# Altium integrated library Samtec_2_mm_Pitch_Socket_Strips.IntLib: 251 symbols (part 2 of 3) (continued)
## SQT-108-01-L-Q
designator J?
Cost-Effective Rugged Socket, Through-hole, Vertical, -55 to 125 degC, 2 mm Pitch, 32-Pin, Female, RoHS; Manufacturer: Samtec; PartNumber: SQT-108-01-L-Q; Pitch: 2 mm; DatasheetVersion: F-214; PackageVersion: BY, 7/1995; PackageReference: SQT-108-01-X-Q; PackageDescription: 2mm Socket Strip Assembly; Orientation: Vertical; RoHS: True; Temperature Range: -55 to 125 degC; Mounting Technology: Through-hole; ComponentLink1Description: Manufacturer URL; ComponentLink1URL: http://www.samtec.com; ComponentLink2Description: Datasheet; ComponentLink2URL: http://www.samtec.com/documents/webfiles/pdf/SQT_TH.PDF; ComponentLink3Description: Package Specification; ComponentLink3URL: http://www.samtec.com/documents/webfiles/cpdf/SQT-1XX-XX-XXX-X-XXX-XXX-MKT.pdf
footprint SMTC-SQT-108-01-X-Q (Socket Strip Assembly, 4x8 Pins, Vertical, 2mm Pitch, Female)
pins: 1, 2, 3, 4, 5, 6, 7, 8, 9, 10, 11, 12, 13, 14, 15, 16, 17, 18, 19, 20, 21, 22, 23, 24, 25, 26, 27, 28, 29, 30, 31, 32

## SQT-112-01-F-D
designator J?
Cost-Effective Rugged Socket, Through-hole, Vertical, -55 to 125 degC, 2 mm Pitch, 24-Pin, Female, RoHS; Manufacturer: Samtec; PartNumber: SQT-112-01-F-D; Pitch: 2 mm; DatasheetVersion: F-214; PackageVersion: BY, 7/1995; PackageReference: SQT-112-01-X-D; PackageDescription: 2mm Socket Strip Assembly; Supplier 1: Digi-Key; Supplier Part Number 1: SQT-112-01-F-D-ND; Supplier 2: Newark; Supplier Part Number 2: 80P8384; Orientation: Vertical; RoHS: True; Temperature Range: -55 to 125 degC; Mounting Technology: Through-hole; ComponentLink1Description: Manufacturer URL; ComponentLink1URL: http://www.samtec.com; ComponentLink2Description: Datasheet; ComponentLink2URL: http://www.samtec.com/documents/webfiles/pdf/SQT_TH.PDF; ComponentLink3Description: Package Specification; ComponentLink3URL: http://www.samtec.com/documents/webfiles/cpdf/SQT-1XX-XX-XXX-X-XXX-XXX-MKT.pdf
footprint SMTC-SQT-112-01-X-D (Socket Strip Assembly, 2x12 Pins, Vertical, 2mm Pitch, Female)
pins: 1, 2, 3, 4, 5, 6, 7, 8, 9, 10, 11, 12, 13, 14, 15, 16, 17, 18, 19, 20, 21, 22, 23, 24

## SQT-112-01-L-D
designator J?
Cost-Effective Rugged Socket, Through-hole, Vertical, -55 to 125 degC, 2 mm Pitch, 24-Pin, Female, RoHS; Manufacturer: Samtec; PartNumber: SQT-112-01-L-D; Pitch: 2 mm; DatasheetVersion: F-214; PackageVersion: BY, 7/1995; PackageReference: SQT-112-01-X-D; PackageDescription: 2mm Socket Strip Assembly; Supplier 1: Digi-Key; Supplier Part Number 1: SAM1245-12-ND; Supplier 2: Newark; Supplier Part Number 2: 11P7278; Orientation: Vertical; RoHS: True; Temperature Range: -55 to 125 degC; Mounting Technology: Through-hole; ComponentLink1Description: Manufacturer URL; ComponentLink1URL: http://www.samtec.com; ComponentLink2Description: Datasheet; ComponentLink2URL: http://www.samtec.com/documents/webfiles/pdf/SQT_TH.PDF; ComponentLink3Description: Package Specification; ComponentLink3URL: http://www.samtec.com/documents/webfiles/cpdf/SQT-1XX-XX-XXX-X-XXX-XXX-MKT.pdf
footprint SMTC-SQT-112-01-X-D (Socket Strip Assembly, 2x12 Pins, Vertical, 2mm Pitch, Female)
pins: 1, 2, 3, 4, 5, 6, 7, 8, 9, 10, 11, 12, 13, 14, 15, 16, 17, 18, 19, 20, 21, 22, 23, 24

## SQT-113-01-F-D
designator J?
Cost-Effective Rugged Socket, Through-hole, Vertical, -55 to 125 degC, 2 mm Pitch, 26-Pin, Female, RoHS; Manufacturer: Samtec; PartNumber: SQT-113-01-F-D; Pitch: 2 mm; DatasheetVersion: F-214; PackageVersion: BY, 7/1995; PackageReference: SQT-113-01-X-D; PackageDescription: 2mm Socket Strip Assembly; Supplier 1: Newark; Supplier Part Number 1: 80P8466; Orientation: Vertical; RoHS: True; Temperature Range: -55 to 125 degC; Mounting Technology: Through-hole; ComponentLink1Description: Manufacturer URL; ComponentLink1URL: http://www.samtec.com; ComponentLink2Description: Datasheet; ComponentLink2URL: http://www.samtec.com/documents/webfiles/pdf/SQT_TH.PDF; ComponentLink3Description: Package Specification; ComponentLink3URL: http://www.samtec.com/documents/webfiles/cpdf/SQT-1XX-XX-XXX-X-XXX-XXX-MKT.pdf
footprint SMTC-SQT-113-01-X-D (Socket Strip Assembly, 2x13 Pins, Vertical, 2mm Pitch, Female)
pins: 1, 2, 3, 4, 5, 6, 7, 8, 9, 10, 11, 12, 13, 14, 15, 16, 17, 18, 19, 20, 21, 22, 23, 24, 25, 26

## SQT-113-01-L-D
designator J?
Cost-Effective Rugged Socket, Through-hole, Vertical, -55 to 125 degC, 2 mm Pitch, 26-Pin, Female, RoHS; Manufacturer: Samtec; PartNumber: SQT-113-01-L-D; Pitch: 2 mm; DatasheetVersion: F-214; PackageVersion: BY, 7/1995; PackageReference: SQT-113-01-X-D; PackageDescription: 2mm Socket Strip Assembly; Supplier 1: Digi-Key; Supplier Part Number 1: SAM1245-13-ND; Supplier 2: Newark; Supplier Part Number 2: 11P7282; Orientation: Vertical; RoHS: True; Temperature Range: -55 to 125 degC; Mounting Technology: Through-hole; ComponentLink1Description: Manufacturer URL; ComponentLink1URL: http://www.samtec.com; ComponentLink2Description: Datasheet; ComponentLink2URL: http://www.samtec.com/documents/webfiles/pdf/SQT_TH.PDF; ComponentLink3Description: Package Specification; ComponentLink3URL: http://www.samtec.com/documents/webfiles/cpdf/SQT-1XX-XX-XXX-X-XXX-XXX-MKT.pdf
footprint SMTC-SQT-113-01-X-D (Socket Strip Assembly, 2x13 Pins, Vertical, 2mm Pitch, Female)
pins: 1, 2, 3, 4, 5, 6, 7, 8, 9, 10, 11, 12, 13, 14, 15, 16, 17, 18, 19, 20, 21, 22, 23, 24, 25, 26

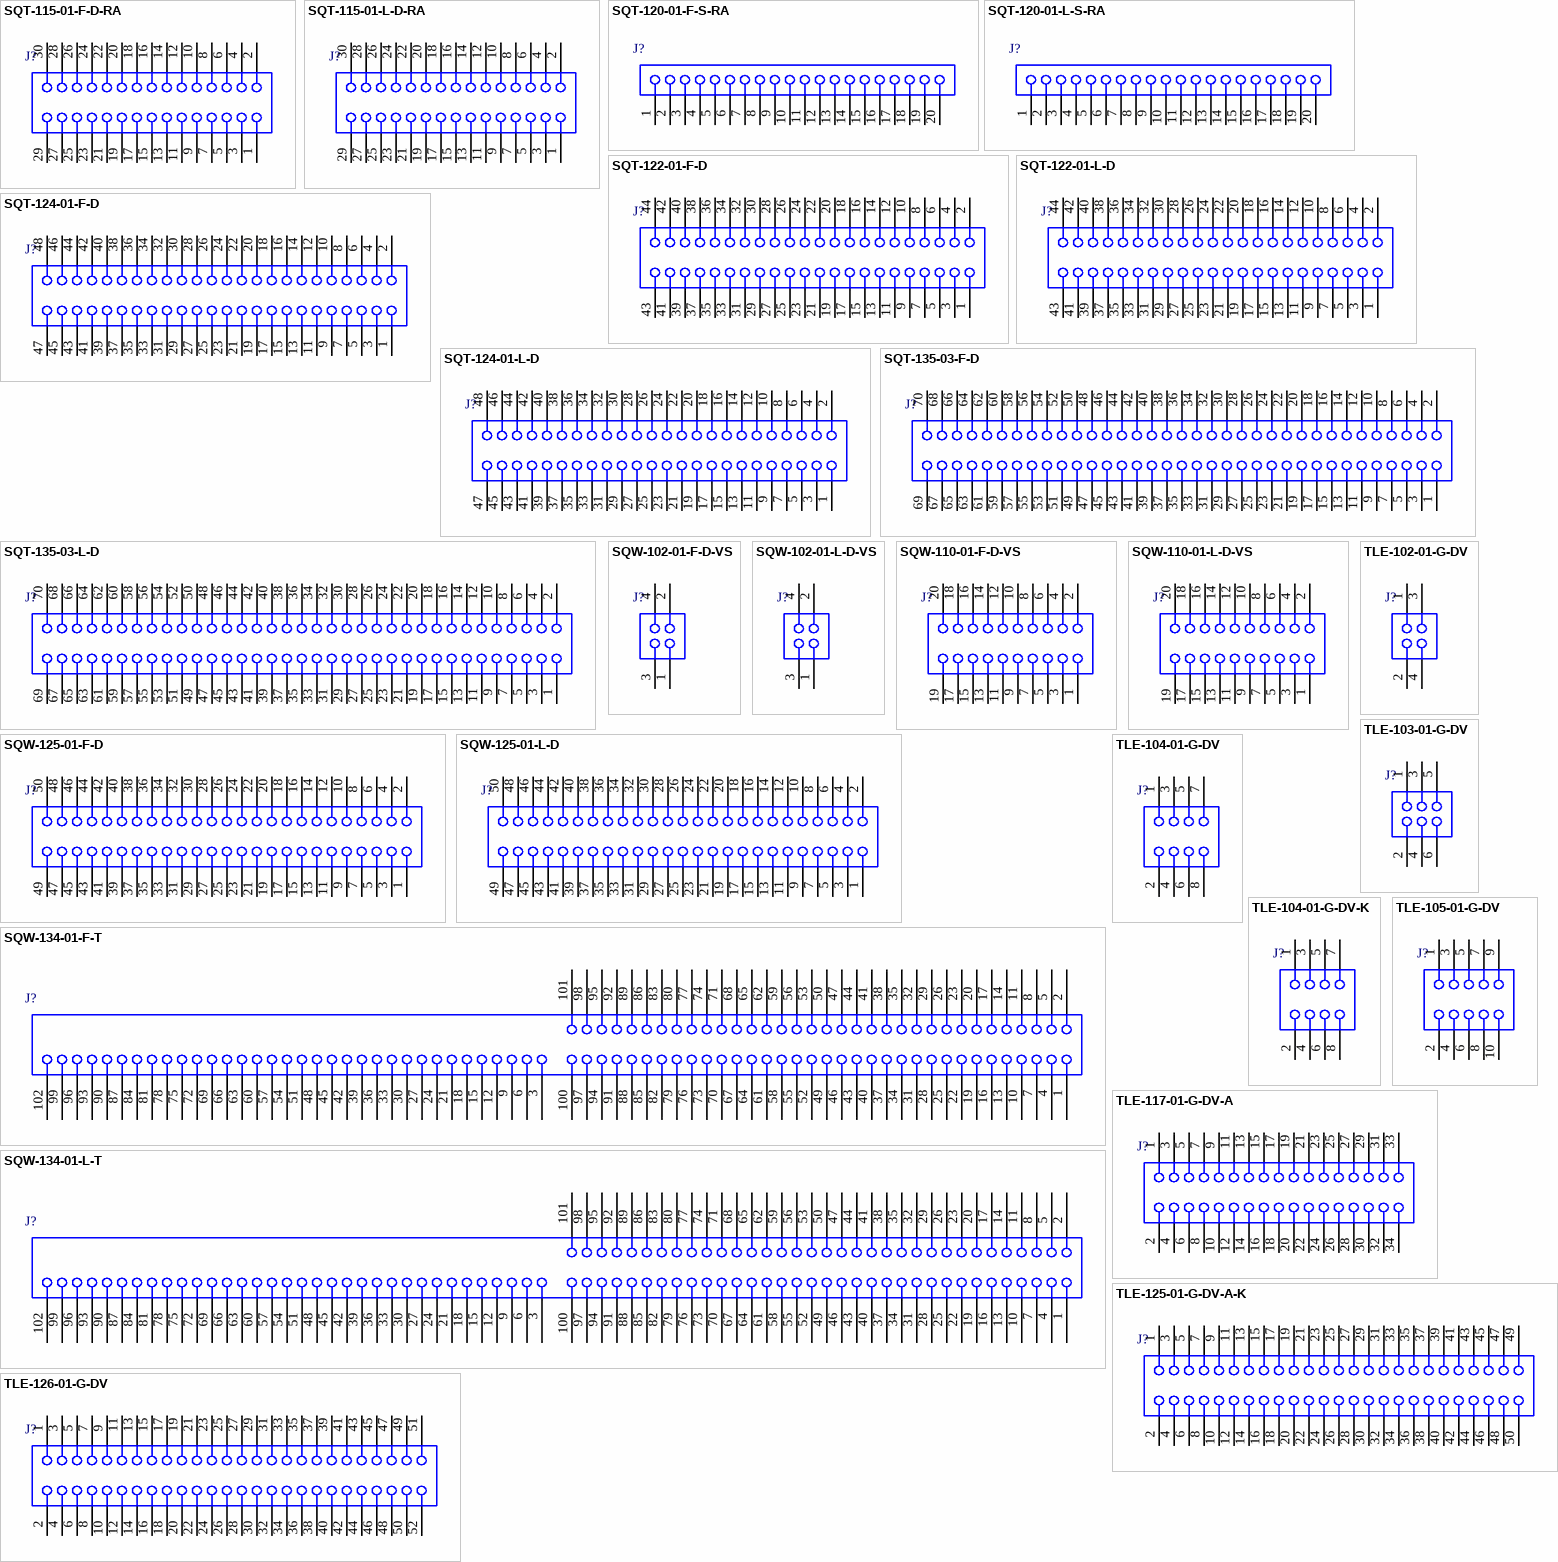
[diagram p6: symbols SQT-115-01-F-D-RA to TLE-126-01-G-DV]

## SQT-115-01-F-D-RA
designator J?
Cost-Effective Rugged Socket, Through-hole, Right Angle, -55 to 125 degC, 2 mm Pitch, 30-Pin, Female, RoHS; Manufacturer: Samtec; PartNumber: SQT-115-01-F-D-RA; Pitch: 2 mm; DatasheetVersion: F-214; PackageVersion: BY, 7/1995; PackageReference: SQT-115-01-X-D-RA; PackageDescription: 2mm Socket Strip Assembly; Supplier 1: Newark; Supplier Part Number 1: 80P8589; Orientation: Right Angle; RoHS: True; Temperature Range: -55 to 125 degC; Mounting Technology: Through-hole; ComponentLink1Description: Manufacturer URL; ComponentLink1URL: http://www.samtec.com; ComponentLink2Description: Datasheet; ComponentLink2URL: http://www.samtec.com/documents/webfiles/pdf/SQT_TH.PDF; ComponentLink3Description: Package Specification; ComponentLink3URL: http://www.samtec.com/documents/webfiles/cpdf/SQT-1XX-XX-XXX-X-XXX-XXX-MKT.pdf
footprint SMTC-SQT-115-01-X-D-RA (Socket Strip Assembly, 2x15 Pins, Right Anlge, 2mm Pitch, Female)
pins: 1, 2, 3, 4, 5, 6, 7, 8, 9, 10, 11, 12, 13, 14, 15, 16, 17, 18, 19, 20, 21, 22, 23, 24, 25, 26, 27, 28, 29, 30

## SQT-115-01-L-D-RA
designator J?
Cost-Effective Rugged Socket, Through-hole, Right Angle, -55 to 125 degC, 2 mm Pitch, 30-Pin, Female, RoHS; Manufacturer: Samtec; PartNumber: SQT-115-01-L-D-RA; Pitch: 2 mm; DatasheetVersion: F-214; PackageVersion: BY, 7/1995; PackageReference: SQT-115-01-X-D-RA; PackageDescription: 2mm Socket Strip Assembly; Supplier 1: Digi-Key; Supplier Part Number 1: SAM1246-15-ND; Supplier 2: Farnell; Supplier Part Number 2: 1668173; Supplier 3: Newark; Supplier Part Number 3: 11P7291; Supplier 4: Newark; Supplier Part Number 4: 15P2721; Orientation: Right Angle; RoHS: True; Temperature Range: -55 to 125 degC; Mounting Technology: Through-hole; ComponentLink1Description: Manufacturer URL; ComponentLink1URL: http://www.samtec.com; ComponentLink2Description: Datasheet; ComponentLink2URL: http://www.samtec.com/documents/webfiles/pdf/SQT_TH.PDF; ComponentLink3Description: Package Specification; ComponentLink3URL: http://www.samtec.com/documents/webfiles/cpdf/SQT-1XX-XX-XXX-X-XXX-XXX-MKT.pdf
footprint SMTC-SQT-115-01-X-D-RA (Socket Strip Assembly, 2x15 Pins, Right Anlge, 2mm Pitch, Female)
pins: 1, 2, 3, 4, 5, 6, 7, 8, 9, 10, 11, 12, 13, 14, 15, 16, 17, 18, 19, 20, 21, 22, 23, 24, 25, 26, 27, 28, 29, 30

## SQT-120-01-F-S-RA
designator J?
Cost-Effective Rugged Socket, Through-hole, Right Angle, -55 to 125 degC, 2 mm Pitch, 20-Pin, Female, RoHS; Manufacturer: Samtec; PartNumber: SQT-120-01-F-S-RA; Pitch: 2 mm; DatasheetVersion: F-214; PackageVersion: BY, 7/1995; PackageReference: SQT-120-01-X-S-RA; PackageDescription: 2mm Socket Strip Assembly; Orientation: Right Angle; RoHS: True; Temperature Range: -55 to 125 degC; Mounting Technology: Through-hole; ComponentLink1Description: Manufacturer URL; ComponentLink1URL: http://www.samtec.com; ComponentLink2Description: Datasheet; ComponentLink2URL: http://www.samtec.com/documents/webfiles/pdf/SQT_TH.PDF; ComponentLink3Description: Package Specification; ComponentLink3URL: http://www.samtec.com/documents/webfiles/cpdf/SQT-1XX-XX-XXX-X-XXX-XXX-MKT.pdf
footprint SMTC-SQT-120-01-X-S-RA (Socket Strip Assembly, 1x20 Pins, Right Anlge, 2mm Pitch, Female)
pins: 1, 2, 3, 4, 5, 6, 7, 8, 9, 10, 11, 12, 13, 14, 15, 16, 17, 18, 19, 20

## SQT-120-01-L-S-RA
designator J?
Cost-Effective Rugged Socket, Through-hole, Right Angle, -55 to 125 degC, 2 mm Pitch, 20-Pin, Female, RoHS; Manufacturer: Samtec; PartNumber: SQT-120-01-L-S-RA; Pitch: 2 mm; DatasheetVersion: F-214; PackageVersion: BY, 7/1995; PackageReference: SQT-120-01-X-S-RA; PackageDescription: 2mm Socket Strip Assembly; Supplier 1: Digi-Key; Supplier Part Number 1: SAM1248-20-ND; Orientation: Right Angle; RoHS: True; Temperature Range: -55 to 125 degC; Mounting Technology: Through-hole; ComponentLink1Description: Manufacturer URL; ComponentLink1URL: http://www.samtec.com; ComponentLink2Description: Datasheet; ComponentLink2URL: http://www.samtec.com/documents/webfiles/pdf/SQT_TH.PDF; ComponentLink3Description: Package Specification; ComponentLink3URL: http://www.samtec.com/documents/webfiles/cpdf/SQT-1XX-XX-XXX-X-XXX-XXX-MKT.pdf
footprint SMTC-SQT-120-01-X-S-RA (Socket Strip Assembly, 1x20 Pins, Right Anlge, 2mm Pitch, Female)
pins: 1, 2, 3, 4, 5, 6, 7, 8, 9, 10, 11, 12, 13, 14, 15, 16, 17, 18, 19, 20

## SQT-122-01-F-D
designator J?
Cost-Effective Rugged Socket, Through-hole, Vertical, -55 to 125 degC, 2 mm Pitch, 44-Pin, Female, RoHS; Manufacturer: Samtec; PartNumber: SQT-122-01-F-D; Pitch: 2 mm; DatasheetVersion: F-214; PackageVersion: BY, 7/1995; PackageReference: SQT-122-01-X-D; PackageDescription: 2mm Socket Strip Assembly; Orientation: Vertical; RoHS: True; Temperature Range: -55 to 125 degC; Mounting Technology: Through-hole; ComponentLink1Description: Manufacturer URL; ComponentLink1URL: http://www.samtec.com; ComponentLink2Description: Datasheet; ComponentLink2URL: http://www.samtec.com/documents/webfiles/pdf/SQT_TH.PDF; ComponentLink3Description: Package Specification; ComponentLink3URL: http://www.samtec.com/documents/webfiles/cpdf/SQT-1XX-XX-XXX-X-XXX-XXX-MKT.pdf
footprint SMTC-SQT-122-01-X-D (Socket Strip Assembly, 2x22 Pins, Vertical, 2mm Pitch, Female)
pins: 1, 2, 3, 4, 5, 6, 7, 8, 9, 10, 11, 12, 13, 14, 15, 16, 17, 18, 19, 20, 21, 22, 23, 24, 25, 26, 27, 28, 29, 30, 31, 32, 33, 34, 35, 36, 37, 38, 39, 40, 41, 42, 43, 44

## SQT-122-01-L-D
designator J?
Cost-Effective Rugged Socket, Through-hole, Vertical, -55 to 125 degC, 2 mm Pitch, 44-Pin, Female, RoHS; Manufacturer: Samtec; PartNumber: SQT-122-01-L-D; Pitch: 2 mm; DatasheetVersion: F-214; PackageVersion: BY, 7/1995; PackageReference: SQT-122-01-X-D; PackageDescription: 2mm Socket Strip Assembly; Supplier 1: Digi-Key; Supplier Part Number 1: SAM1245-22-ND; Supplier 2: Newark; Supplier Part Number 2: 11P7317; Orientation: Vertical; RoHS: True; Temperature Range: -55 to 125 degC; Mounting Technology: Through-hole; ComponentLink1Description: Manufacturer URL; ComponentLink1URL: http://www.samtec.com; ComponentLink2Description: Datasheet; ComponentLink2URL: http://www.samtec.com/documents/webfiles/pdf/SQT_TH.PDF; ComponentLink3Description: Package Specification; ComponentLink3URL: http://www.samtec.com/documents/webfiles/cpdf/SQT-1XX-XX-XXX-X-XXX-XXX-MKT.pdf
footprint SMTC-SQT-122-01-X-D (Socket Strip Assembly, 2x22 Pins, Vertical, 2mm Pitch, Female)
pins: 1, 2, 3, 4, 5, 6, 7, 8, 9, 10, 11, 12, 13, 14, 15, 16, 17, 18, 19, 20, 21, 22, 23, 24, 25, 26, 27, 28, 29, 30, 31, 32, 33, 34, 35, 36, 37, 38, 39, 40, 41, 42, 43, 44

## SQT-124-01-F-D
designator J?
Cost-Effective Rugged Socket, Through-hole, Vertical, -55 to 125 degC, 2 mm Pitch, 48-Pin, Female, RoHS; Manufacturer: Samtec; PartNumber: SQT-124-01-F-D; Pitch: 2 mm; DatasheetVersion: F-214; PackageVersion: BY, 7/1995; PackageReference: SQT-124-01-X-D; PackageDescription: 2mm Socket Strip Assembly; Orientation: Vertical; RoHS: True; Temperature Range: -55 to 125 degC; Mounting Technology: Through-hole; ComponentLink1Description: Manufacturer URL; ComponentLink1URL: http://www.samtec.com; ComponentLink2Description: Datasheet; ComponentLink2URL: http://www.samtec.com/documents/webfiles/pdf/SQT_TH.PDF; ComponentLink3Description: Package Specification; ComponentLink3URL: http://www.samtec.com/documents/webfiles/cpdf/SQT-1XX-XX-XXX-X-XXX-XXX-MKT.pdf
footprint SMTC-SQT-124-01-X-D (Socket Strip Assembly, 2x24 Pins, Vertical, 2mm Pitch, Female)
pins: 1, 2, 3, 4, 5, 6, 7, 8, 9, 10, 11, 12, 13, 14, 15, 16, 17, 18, 19, 20, 21, 22, 23, 24, 25, 26, 27, 28, 29, 30, 31, 32, 33, 34, 35, 36, 37, 38, 39, 40, 41, 42, 43, 44, 45, 46, 47, 48

## SQT-124-01-L-D
designator J?
Cost-Effective Rugged Socket, Through-hole, Vertical, -55 to 125 degC, 2 mm Pitch, 48-Pin, Female, RoHS; Manufacturer: Samtec; PartNumber: SQT-124-01-L-D; Pitch: 2 mm; DatasheetVersion: F-214; PackageVersion: BY, 7/1995; PackageReference: SQT-124-01-X-D; PackageDescription: 2mm Socket Strip Assembly; Supplier 1: Digi-Key; Supplier Part Number 1: SAM1245-24-ND; Orientation: Vertical; RoHS: True; Temperature Range: -55 to 125 degC; Mounting Technology: Through-hole; ComponentLink1Description: Manufacturer URL; ComponentLink1URL: http://www.samtec.com; ComponentLink2Description: Datasheet; ComponentLink2URL: http://www.samtec.com/documents/webfiles/pdf/SQT_TH.PDF; ComponentLink3Description: Package Specification; ComponentLink3URL: http://www.samtec.com/documents/webfiles/cpdf/SQT-1XX-XX-XXX-X-XXX-XXX-MKT.pdf
footprint SMTC-SQT-124-01-X-D (Socket Strip Assembly, 2x24 Pins, Vertical, 2mm Pitch, Female)
pins: 1, 2, 3, 4, 5, 6, 7, 8, 9, 10, 11, 12, 13, 14, 15, 16, 17, 18, 19, 20, 21, 22, 23, 24, 25, 26, 27, 28, 29, 30, 31, 32, 33, 34, 35, 36, 37, 38, 39, 40, 41, 42, 43, 44, 45, 46, 47, 48

## SQT-135-03-F-D
designator J?
Cost-Effective Rugged Socket, Through-hole, Vertical, -55 to 125 degC, 2 mm Pitch, 70-Pin, Female, RoHS; Manufacturer: Samtec; PartNumber: SQT-135-03-F-D; Pitch: 2 mm; DatasheetVersion: F-214; PackageVersion: BY, 7/1995; PackageReference: SQT-135-03-X-D; PackageDescription: 2mm Socket Strip Assembly; Orientation: Vertical; RoHS: True; Temperature Range: -55 to 125 degC; Mounting Technology: Through-hole; ComponentLink1Description: Manufacturer URL; ComponentLink1URL: http://www.samtec.com; ComponentLink2Description: Datasheet; ComponentLink2URL: http://www.samtec.com/documents/webfiles/pdf/SQT_TH.PDF; ComponentLink3Description: Package Specification; ComponentLink3URL: http://www.samtec.com/documents/webfiles/cpdf/SQT-1XX-XX-XXX-X-XXX-XXX-MKT.pdf
footprint SMTC-SQT-135-03-X-D (Socket Strip Assembly, 2x35 Pins, Vertical, 2mm Pitch, Female)
pins: 1, 2, 3, 4, 5, 6, 7, 8, 9, 10, 11, 12, 13, 14, 15, 16, 17, 18, 19, 20, 21, 22, 23, 24, 25, 26, 27, 28, 29, 30, 31, 32, 33, 34, 35, 36, 37, 38, 39, 40, 41, 42, 43, 44, 45, 46, 47, 48, 49, 50, 51, 52, 53, 54, 55, 56, 57, 58, 59, 60, 61, 62, 63, 64, 65, 66, 67, 68, 69, 70

## SQT-135-03-L-D
designator J?
Cost-Effective Rugged Socket, Through-hole, Vertical, -55 to 125 degC, 2 mm Pitch, 70-Pin, Female, RoHS; Manufacturer: Samtec; PartNumber: SQT-135-03-L-D; Pitch: 2 mm; DatasheetVersion: F-214; PackageVersion: BY, 7/1995; PackageReference: SQT-135-03-X-D; PackageDescription: 2mm Socket Strip Assembly; Supplier 1: Newark; Supplier Part Number 1: 80P9680; Orientation: Vertical; RoHS: True; Temperature Range: -55 to 125 degC; Mounting Technology: Through-hole; ComponentLink1Description: Manufacturer URL; ComponentLink1URL: http://www.samtec.com; ComponentLink2Description: Datasheet; ComponentLink2URL: http://www.samtec.com/documents/webfiles/pdf/SQT_TH.PDF; ComponentLink3Description: Package Specification; ComponentLink3URL: http://www.samtec.com/documents/webfiles/cpdf/SQT-1XX-XX-XXX-X-XXX-XXX-MKT.pdf
footprint SMTC-SQT-135-03-X-D (Socket Strip Assembly, 2x35 Pins, Vertical, 2mm Pitch, Female)
pins: 1, 2, 3, 4, 5, 6, 7, 8, 9, 10, 11, 12, 13, 14, 15, 16, 17, 18, 19, 20, 21, 22, 23, 24, 25, 26, 27, 28, 29, 30, 31, 32, 33, 34, 35, 36, 37, 38, 39, 40, 41, 42, 43, 44, 45, 46, 47, 48, 49, 50, 51, 52, 53, 54, 55, 56, 57, 58, 59, 60, 61, 62, 63, 64, 65, 66, 67, 68, 69, 70

## SQW-102-01-F-D-VS
designator J?
Cost-Effective Rugged Socket, Surface Mount, Vertical, -55 to 125 degC, 2 mm Pitch, 4-Pin, Female, RoHS; Manufacturer: Samtec; PartNumber: SQW-102-01-F-D-VS; Pitch: 2 mm; DatasheetVersion: F-214; PackageVersion: AI, 4/1997; PackageReference: SQW-102-01-X-D-VS; PackageDescription: 2mm Sockets Trip Assembly; Orientation: Vertical; RoHS: True; Temperature Range: -55 to 125 degC; Mounting Technology: Surface Mount; ComponentLink1Description: Manufacturer URL; ComponentLink1URL: http://www.samtec.com; ComponentLink2Description: Datasheet; ComponentLink2URL: http://www.samtec.com/documents/webfiles/pdf/SQW.PDF; ComponentLink3Description: Package Specification; ComponentLink3URL: http://www.samtec.com/documents/webfiles/cpdf/SQW-1XX-01-XXX-D-VS-XX-XXX-MKT.pdf
footprint SMTC-SQW-102-01-X-D-VS (Socket Strip Assembly, 2x2 Pins, Vertical, 2mm Pitch, Female)
pins: 1, 2, 3, 4

## SQW-102-01-L-D-VS
designator J?
Cost-Effective Rugged Socket, Surface Mount, Vertical, -55 to 125 degC, 2 mm Pitch, 4-Pin, Female, RoHS; Manufacturer: Samtec; PartNumber: SQW-102-01-L-D-VS; Pitch: 2 mm; DatasheetVersion: F-214; PackageVersion: AI, 4/1997; PackageReference: SQW-102-01-X-D-VS; PackageDescription: 2mm Sockets Trip Assembly; Supplier 1: Digi-Key; Supplier Part Number 1: SAM1250-02-ND; Supplier 2: Newark; Supplier Part Number 2: 11P7408; Orientation: Vertical; RoHS: True; Temperature Range: -55 to 125 degC; Mounting Technology: Surface Mount; ComponentLink1Description: Manufacturer URL; ComponentLink1URL: http://www.samtec.com; ComponentLink2Description: Datasheet; ComponentLink2URL: http://www.samtec.com/documents/webfiles/pdf/SQW.PDF; ComponentLink3Description: Package Specification; ComponentLink3URL: http://www.samtec.com/documents/webfiles/cpdf/SQW-1XX-01-XXX-D-VS-XX-XXX-MKT.pdf
footprint SMTC-SQW-102-01-X-D-VS (Socket Strip Assembly, 2x2 Pins, Vertical, 2mm Pitch, Female)
pins: 1, 2, 3, 4

## SQW-110-01-F-D-VS
designator J?
Cost-Effective Rugged Socket, Surface Mount, Vertical, -55 to 125 degC, 2 mm Pitch, 20-Pin, Female, RoHS; Manufacturer: Samtec; PartNumber: SQW-110-01-F-D-VS; Pitch: 2 mm; DatasheetVersion: F-214; PackageVersion: AI, 4/1997; PackageReference: SQW-110-01-X-D-VS; PackageDescription: 2mm Sockets Trip Assembly; Orientation: Vertical; RoHS: True; Temperature Range: -55 to 125 degC; Mounting Technology: Surface Mount; ComponentLink1Description: Manufacturer URL; ComponentLink1URL: http://www.samtec.com; ComponentLink2Description: Datasheet; ComponentLink2URL: http://www.samtec.com/documents/webfiles/pdf/SQW.PDF; ComponentLink3Description: Package Specification; ComponentLink3URL: http://www.samtec.com/documents/webfiles/cpdf/SQW-1XX-01-XXX-D-VS-XX-XXX-MKT.pdf
footprint SMTC-SQW-110-01-X-D-VS (Socket Strip Assembly, 2x10 Pins, Vertical, 2mm Pitch, Female)
pins: 1, 2, 3, 4, 5, 6, 7, 8, 9, 10, 11, 12, 13, 14, 15, 16, 17, 18, 19, 20

## SQW-110-01-L-D-VS
designator J?
Cost-Effective Rugged Socket, Surface Mount, Vertical, -55 to 125 degC, 2 mm Pitch, 20-Pin, Female, RoHS; Manufacturer: Samtec; PartNumber: SQW-110-01-L-D-VS; Pitch: 2 mm; DatasheetVersion: F-214; PackageVersion: AI, 4/1997; PackageReference: SQW-110-01-X-D-VS; PackageDescription: 2mm Sockets Trip Assembly; Supplier 1: Digi-Key; Supplier Part Number 1: SAM1250-10-ND; Supplier 2: Newark; Supplier Part Number 2: 11P7424; Orientation: Vertical; RoHS: True; Temperature Range: -55 to 125 degC; Mounting Technology: Surface Mount; ComponentLink1Description: Manufacturer URL; ComponentLink1URL: http://www.samtec.com; ComponentLink2Description: Datasheet; ComponentLink2URL: http://www.samtec.com/documents/webfiles/pdf/SQW.PDF; ComponentLink3Description: Package Specification; ComponentLink3URL: http://www.samtec.com/documents/webfiles/cpdf/SQW-1XX-01-XXX-D-VS-XX-XXX-MKT.pdf
footprint SMTC-SQW-110-01-X-D-VS (Socket Strip Assembly, 2x10 Pins, Vertical, 2mm Pitch, Female)
pins: 1, 2, 3, 4, 5, 6, 7, 8, 9, 10, 11, 12, 13, 14, 15, 16, 17, 18, 19, 20

## SQW-125-01-F-D
designator J?
Cost-Effective Rugged Socket, Through-hole, Vertical, -55 to 125 degC, 2 mm Pitch, 50-Pin, Female, RoHS; Manufacturer: Samtec; PartNumber: SQW-125-01-F-D; Pitch: 2 mm; DatasheetVersion: F-214; PackageVersion: F, 8/1997; PackageReference: SQW-125-01-X-D; PackageDescription: 2mm Socket Strip Assembly; Orientation: Vertical; RoHS: True; Temperature Range: -55 to 125 degC; Mounting Technology: Through-hole; ComponentLink1Description: Manufacturer URL; ComponentLink1URL: http://www.samtec.com; ComponentLink2Description: Datasheet; ComponentLink2URL: http://www.samtec.com/documents/webfiles/pdf/SQW.PDF; ComponentLink3Description: Package Specification; ComponentLink3URL: http://www.samtec.com/documents/webfiles/cpdf/SQW-1XX-01-X-X-XXX-MKT.pdf
footprint SMTC-SQW-125-01-X-D (Socket Strip Assembly, 2x25 Pins, Vertical, 2mm Pitch, Female)
pins: 1, 2, 3, 4, 5, 6, 7, 8, 9, 10, 11, 12, 13, 14, 15, 16, 17, 18, 19, 20, 21, 22, 23, 24, 25, 26, 27, 28, 29, 30, 31, 32, 33, 34, 35, 36, 37, 38, 39, 40, 41, 42, 43, 44, 45, 46, 47, 48, 49, 50

## SQW-125-01-L-D
designator J?
Cost-Effective Rugged Socket, Through-hole, Vertical, -55 to 125 degC, 2 mm Pitch, 50-Pin, Female, RoHS; Manufacturer: Samtec; PartNumber: SQW-125-01-L-D; Pitch: 2 mm; DatasheetVersion: F-214; PackageVersion: F, 8/1997; PackageReference: SQW-125-01-X-D; PackageDescription: 2mm Socket Strip Assembly; Supplier 1: Digi-Key; Supplier Part Number 1: SAM1249-25-ND; Supplier 2: Farnell; Supplier Part Number 2: 1668196; Supplier 3: Newark; Supplier Part Number 3: 11P7453; Supplier 4: Newark; Supplier Part Number 4: 15P2742; Orientation: Vertical; RoHS: True; Temperature Range: -55 to 125 degC; Mounting Technology: Through-hole; ComponentLink1Description: Manufacturer URL; ComponentLink1URL: http://www.samtec.com; ComponentLink2Description: Datasheet; ComponentLink2URL: http://www.samtec.com/documents/webfiles/pdf/SQW.PDF; ComponentLink3Description: Package Specification; ComponentLink3URL: http://www.samtec.com/documents/webfiles/cpdf/SQW-1XX-01-X-X-XXX-MKT.pdf
footprint SMTC-SQW-125-01-X-D (Socket Strip Assembly, 2x25 Pins, Vertical, 2mm Pitch, Female)
pins: 1, 2, 3, 4, 5, 6, 7, 8, 9, 10, 11, 12, 13, 14, 15, 16, 17, 18, 19, 20, 21, 22, 23, 24, 25, 26, 27, 28, 29, 30, 31, 32, 33, 34, 35, 36, 37, 38, 39, 40, 41, 42, 43, 44, 45, 46, 47, 48, 49, 50

## SQW-134-01-F-T
designator J?
Cost-Effective Rugged Socket, Through-hole, Vertical, -55 to 125 degC, 2 mm Pitch, 102-Pin, Female, RoHS; Manufacturer: Samtec; PartNumber: SQW-134-01-F-T; Pitch: 2 mm; DatasheetVersion: F-214; PackageVersion: F, 8/1997; PackageReference: SQW-134-01-X-T; PackageDescription: 2mm Socket Strip Assembly; Orientation: Vertical; RoHS: True; Temperature Range: -55 to 125 degC; Mounting Technology: Through-hole; ComponentLink1Description: Manufacturer URL; ComponentLink1URL: http://www.samtec.com; ComponentLink2Description: Datasheet; ComponentLink2URL: http://www.samtec.com/documents/webfiles/pdf/SQW.PDF; ComponentLink3Description: Package Specification; ComponentLink3URL: http://www.samtec.com/documents/webfiles/cpdf/SQW-1XX-01-X-X-XXX-MKT.pdf
footprint SMTC-SQW-134-01-X-T (Socket Strip Assembly, 3x34 Pins, Vertical, 2mm Pitch, Female)
pins: 1, 2, 3, 4, 5, 6, 7, 8, 9, 10, 11, 12, 13, 14, 15, 16, 17, 18, 19, 20, 21, 22, 23, 24, 25, 26, 27, 28, 29, 30, 31, 32, 33, 34, 35, 36, 37, 38, 39, 40, 41, 42, 43, 44, 45, 46, 47, 48, 49, 50, 51, 52, 53, 54, 55, 56, 57, 58, 59, 60, 61, 62, 63, 64, 65, 66, 67, 68, 69, 70, 71, 72, 73, 74, 75, 76, 77, 78, 79, 80, 81, 82, 83, 84, 85, 86, 87, 88, 89, 90, 91, 92, 93, 94, 95, 96, 97, 98, 99, 100, 101, 102

## SQW-134-01-L-T
designator J?
Cost-Effective Rugged Socket, Through-hole, Vertical, -55 to 125 degC, 2 mm Pitch, 102-Pin, Female, RoHS; Manufacturer: Samtec; PartNumber: SQW-134-01-L-T; Pitch: 2 mm; DatasheetVersion: F-214; PackageVersion: F, 8/1997; PackageReference: SQW-134-01-X-T; PackageDescription: 2mm Socket Strip Assembly; Supplier 1: Newark; Supplier Part Number 1: 81P1460; Orientation: Vertical; RoHS: True; Temperature Range: -55 to 125 degC; Mounting Technology: Through-hole; ComponentLink1Description: Manufacturer URL; ComponentLink1URL: http://www.samtec.com; ComponentLink2Description: Datasheet; ComponentLink2URL: http://www.samtec.com/documents/webfiles/pdf/SQW.PDF; ComponentLink3Description: Package Specification; ComponentLink3URL: http://www.samtec.com/documents/webfiles/cpdf/SQW-1XX-01-X-X-XXX-MKT.pdf
footprint SMTC-SQW-134-01-X-T (Socket Strip Assembly, 3x34 Pins, Vertical, 2mm Pitch, Female)
pins: 1, 2, 3, 4, 5, 6, 7, 8, 9, 10, 11, 12, 13, 14, 15, 16, 17, 18, 19, 20, 21, 22, 23, 24, 25, 26, 27, 28, 29, 30, 31, 32, 33, 34, 35, 36, 37, 38, 39, 40, 41, 42, 43, 44, 45, 46, 47, 48, 49, 50, 51, 52, 53, 54, 55, 56, 57, 58, 59, 60, 61, 62, 63, 64, 65, 66, 67, 68, 69, 70, 71, 72, 73, 74, 75, 76, 77, 78, 79, 80, 81, 82, 83, 84, 85, 86, 87, 88, 89, 90, 91, 92, 93, 94, 95, 96, 97, 98, 99, 100, 101, 102

## TLE-102-01-G-DV
designator J?
Cost-Effective Reliable Socket, Surface Mount, Vertical, -55 to 125 degC, 2 mm Pitch, 4-Pin, Female, RoHS; Manufacturer: Samtec; PartNumber: TLE-102-01-G-DV; Pitch: 2 mm; DatasheetVersion: F-214; PackageVersion: AC, 1/1997; PackageReference: TLE-102-01-X-DV; PackageDescription: Dual Row 2 mm x 2 mm Assembly; Supplier 1: Digi-Key; Supplier Part Number 1: SAM1251-02-ND; Supplier 2: Farnell; Supplier Part Number 2: 1668466; Orientation: Vertical; RoHS: True; Temperature Range: -55 to 125 degC; Mounting Technology: Surface Mount; ComponentLink1Description: Manufacturer URL; ComponentLink1URL: http://www.samtec.com; ComponentLink2Description: Datasheet; ComponentLink2URL: http://www.samtec.com/documents/webfiles/pdf/TLE.PDF; ComponentLink3Description: Package Specification; ComponentLink3URL: http://www.samtec.com/documents/webfiles/cpdf/TLE-1XX-XX-X-DV-X-MKT2.pdf
footprint SMTC-TLE-102-01-X-DV (Dual Row Assembly, 2x2 Pins, Vertical, 2mm Pitch, Female)
pins: 1, 2, 3, 4

## TLE-103-01-G-DV
designator J?
Cost-Effective Reliable Socket, Surface Mount, Vertical, -55 to 125 degC, 2 mm Pitch, 6-Pin, Female, RoHS; Manufacturer: Samtec; PartNumber: TLE-103-01-G-DV; Pitch: 2 mm; DatasheetVersion: F-214; PackageVersion: AC, 1/1997; PackageReference: TLE-103-01-X-DV; PackageDescription: Dual Row 2 mm x 2 mm Assembly; Supplier 1: Digi-Key; Supplier Part Number 1: SAM1251-03-ND; Supplier 2: Farnell; Supplier Part Number 2: 1668467; Orientation: Vertical; RoHS: True; Temperature Range: -55 to 125 degC; Mounting Technology: Surface Mount; ComponentLink1Description: Manufacturer URL; ComponentLink1URL: http://www.samtec.com; ComponentLink2Description: Datasheet; ComponentLink2URL: http://www.samtec.com/documents/webfiles/pdf/TLE.PDF; ComponentLink3Description: Package Specification; ComponentLink3URL: http://www.samtec.com/documents/webfiles/cpdf/TLE-1XX-XX-X-DV-X-MKT2.pdf
footprint SMTC-TLE-103-01-X-DV (Dual Row Assembly, 2x3 Pins, Vertical, 2mm Pitch, Female)
pins: 1, 2, 3, 4, 5, 6

## TLE-104-01-G-DV
designator J?
Cost-Effective Reliable Socket, Surface Mount, Vertical, -55 to 125 degC, 2 mm Pitch, 8-Pin, Female, RoHS; Manufacturer: Samtec; PartNumber: TLE-104-01-G-DV; Pitch: 2 mm; DatasheetVersion: F-214; PackageVersion: AC, 1/1997; PackageReference: TLE-104-01-X-DV; PackageDescription: Dual Row 2 mm x 2 mm Assembly; Supplier 1: Digi-Key; Supplier Part Number 1: SAM1251-04-ND; Supplier 2: Farnell; Supplier Part Number 2: 1668469; Orientation: Vertical; RoHS: True; Temperature Range: -55 to 125 degC; Mounting Technology: Surface Mount; ComponentLink1Description: Manufacturer URL; ComponentLink1URL: http://www.samtec.com; ComponentLink2Description: Datasheet; ComponentLink2URL: http://www.samtec.com/documents/webfiles/pdf/TLE.PDF; ComponentLink3Description: Package Specification; ComponentLink3URL: http://www.samtec.com/documents/webfiles/cpdf/TLE-1XX-XX-X-DV-X-MKT2.pdf
footprint SMTC-TLE-104-01-X-DV (Dual Row Assembly, 2x4 Pins, Vertical, 2mm Pitch, Female)
pins: 1, 2, 3, 4, 5, 6, 7, 8

## TLE-104-01-G-DV-K
designator J?
Cost-Effective Reliable Socket, Surface Mount, Vertical, -55 to 125 degC, 2 mm Pitch, 8-Pin, Female, RoHS; Manufacturer: Samtec; PartNumber: TLE-104-01-G-DV-K; Pitch: 2 mm; DatasheetVersion: F-214; PackageVersion: AC, 1/1997; PackageReference: TLE-104-01-X-DV-K; PackageDescription: Dual Row 2 mm x 2 mm Assembly; Orientation: Vertical; RoHS: True; Temperature Range: -55 to 125 degC; Mounting Technology: Surface Mount; ComponentLink1Description: Manufacturer URL; ComponentLink1URL: http://www.samtec.com; ComponentLink2Description: Datasheet; ComponentLink2URL: http://www.samtec.com/documents/webfiles/pdf/TLE.PDF; ComponentLink3Description: Package Specification; ComponentLink3URL: http://www.samtec.com/documents/webfiles/cpdf/TLE-1XX-XX-X-DV-X-MKT2.pdf
footprint SMTC-TLE-104-01-X-DV-K (Dual Row Assembly, 2x4 Pins, Vertical, 2mm Pitch, Female)
pins: 1, 2, 3, 4, 5, 6, 7, 8

## TLE-105-01-G-DV
designator J?
Cost-Effective Reliable Socket, Surface Mount, Vertical, -55 to 125 degC, 2 mm Pitch, 10-Pin, Female, RoHS; Manufacturer: Samtec; PartNumber: TLE-105-01-G-DV; Pitch: 2 mm; DatasheetVersion: F-214; PackageVersion: AC, 1/1997; PackageReference: TLE-105-01-X-DV; PackageDescription: Dual Row 2 mm x 2 mm Assembly; Supplier 1: Digi-Key; Supplier Part Number 1: SAM1251-05-ND; Supplier 2: Farnell; Supplier Part Number 2: 1668471; Orientation: Vertical; RoHS: True; Temperature Range: -55 to 125 degC; Mounting Technology: Surface Mount; ComponentLink1Description: Manufacturer URL; ComponentLink1URL: http://www.samtec.com; ComponentLink2Description: Datasheet; ComponentLink2URL: http://www.samtec.com/documents/webfiles/pdf/TLE.PDF; ComponentLink3Description: Package Specification; ComponentLink3URL: http://www.samtec.com/documents/webfiles/cpdf/TLE-1XX-XX-X-DV-X-MKT2.pdf
footprint SMTC-TLE-105-01-X-DV (Dual Row Assembly, 2x5 Pins, Vertical, 2mm Pitch, Female)
pins: 1, 2, 3, 4, 5, 6, 7, 8, 9, 10

## TLE-117-01-G-DV-A
designator J?
Cost-Effective Reliable Socket, Surface Mount, Vertical, -55 to 125 degC, 2 mm Pitch, 34-Pin, Female, RoHS; Manufacturer: Samtec; PartNumber: TLE-117-01-G-DV-A; Pitch: 2 mm; DatasheetVersion: F-214; PackageVersion: AC, 1/1997; PackageReference: TLE-117-01-X-DV-A; PackageDescription: Dual Row 2 mm x 2 mm Assembly; Orientation: Vertical; RoHS: True; Temperature Range: -55 to 125 degC; Mounting Technology: Surface Mount; ComponentLink1Description: Manufacturer URL; ComponentLink1URL: http://www.samtec.com; ComponentLink2Description: Datasheet; ComponentLink2URL: http://www.samtec.com/documents/webfiles/pdf/TLE.PDF; ComponentLink3Description: Package Specification; ComponentLink3URL: http://www.samtec.com/documents/webfiles/cpdf/TLE-1XX-XX-X-DV-X-MKT2.pdf
footprint SMTC-TLE-117-01-X-DV-A (Dual Row Assembly, 2x17 Pins, Vertical, 2mm Pitch, Female)
pins: 1, 2, 3, 4, 5, 6, 7, 8, 9, 10, 11, 12, 13, 14, 15, 16, 17, 18, 19, 20, 21, 22, 23, 24, 25, 26, 27, 28, 29, 30, 31, 32, 33, 34